# Altium footprint library SMT.PcbLib: 379 footprints (part 8 of 24)
Each footprint in its own frame and in the unit in brackets; x right, y up, seen from the top. Pads: shape width x height; smd on the part's side, far side on the other; paste and mask are expansions set on the pad; w line width, h text height; cw(c..) or ccw(c..) is an arc to the next point about the centre after c.
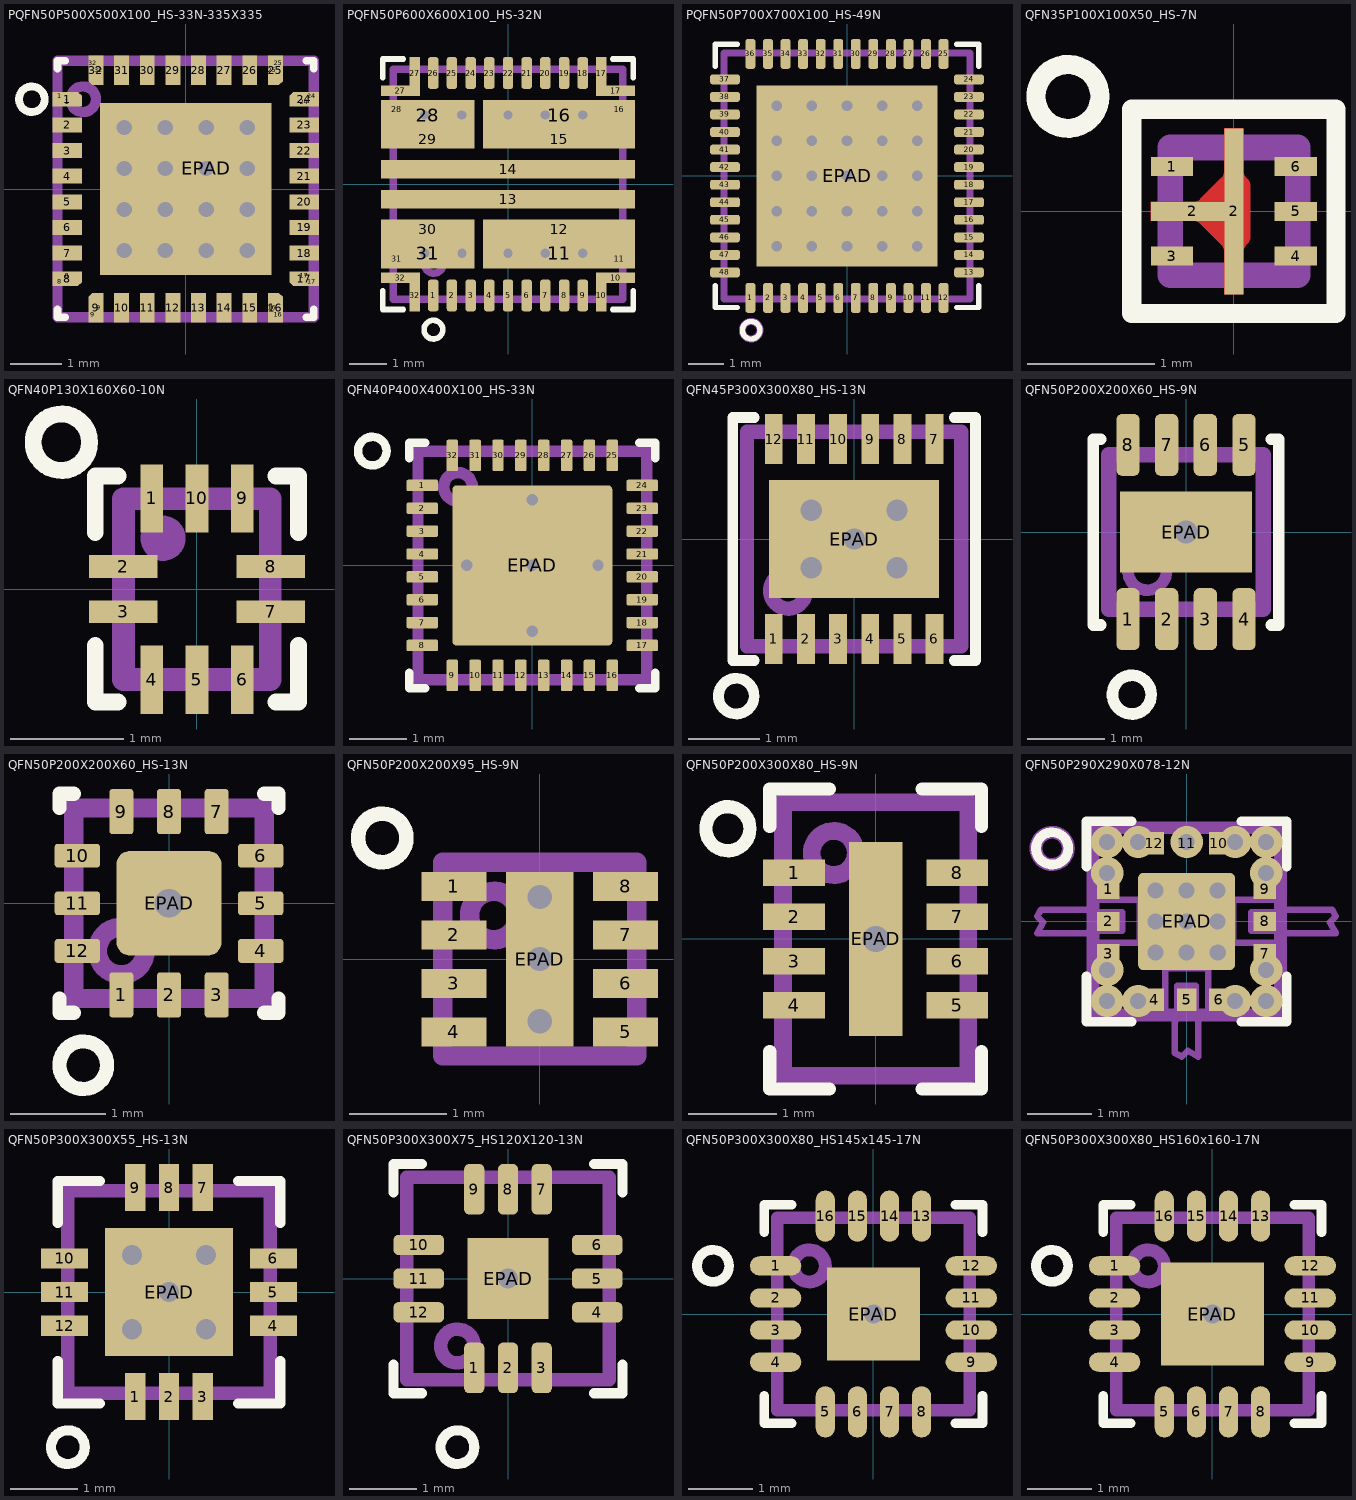
[diagram p7: the footprints below, top view; thin cyan lines are the x and y axes]

## PQFN50P500X500X100_HS-33N-335X335 [mm] "PQFN, 32-Leads, Body 5,00x5,00mm, Pitch 0,50mm, Thermal Pad 3,3x3,3mm, IPC Medium Density"
height 0.85
pads (49):
  rect 0.288x0.17 smd paste+0 mask+0.05: 1(-2.457,1.81) 8(-2.457,-1.81) 17(2.457,-1.81) 24(2.457,1.81)
  oct 0.575x0.29 smd paste+0 mask+0.05: 1(-2.313,1.75) 8(-2.313,-1.75) 17(2.313,-1.75) 24(2.313,1.75)
  rect 0.575x0.17 smd paste+0 mask+0.05: 1(-2.313,1.69) 8(-2.313,-1.69) 17(2.313,-1.69) 24(2.313,1.69)
  rect 0.575x0.29 smd paste+0 mask+0.05: 2(-2.313,1.25) 3(-2.313,0.75) 4(-2.313,0.25) 5(-2.313,-0.25) 6(-2.313,-0.75) 7(-2.313,-1.25) 18(2.313,-1.25) 19(2.313,-0.75) 20(2.313,-0.25) 21(2.313,0.25) 22(2.313,0.75) 23(2.313,1.25)
  rect 0.17x0.288 smd paste+0 mask+0.05: 9(-1.81,-2.457) 16(1.81,-2.457) 25(1.81,2.457) 32(-1.81,2.457)
  oct 0.29x0.575 smd paste+0 mask+0.05: 9(-1.75,-2.313) 16(1.75,-2.313) 25(1.75,2.313) 32(-1.75,2.313)
  rect 0.17x0.575 smd paste+0 mask+0.05: 9(-1.69,-2.313) 16(1.69,-2.313) 25(1.69,2.313) 32(-1.69,2.313)
  rect 0.29x0.575 smd paste+0 mask+0.05: 10(-1.25,-2.313) 11(-0.75,-2.313) 12(-0.25,-2.313) 13(0.25,-2.313) 14(0.75,-2.313) 15(1.25,-2.313) 26(1.25,2.313) 27(0.75,2.313) 28(0.25,2.313) 29(-0.25,2.313) 30(-0.75,2.313) 31(-1.25,2.313)
  rect 3.35x3.35 hole 0.3 copper offset -0.4,-0.4 mask+0.1: EPAD(0.4,0.4)
via -0.4,0.4 diameter 0.6 hole 0.3
via -0.4,-0.4 diameter 0.6 hole 0.3
via 0.4,-0.4 diameter 0.6 hole 0.3
via -0.4,-1.2 diameter 0.6 hole 0.3
via 0.4,-1.2 diameter 0.6 hole 0.3
via -1.2,-0.4 diameter 0.6 hole 0.3
via -1.2,0.4 diameter 0.6 hole 0.3
via -0.4,1.2 diameter 0.6 hole 0.3
via -1.2,1.2 diameter 0.6 hole 0.3
via -1.2,-1.2 diameter 0.6 hole 0.3
via 1.2,-1.2 diameter 0.6 hole 0.3
via 1.2,-0.4 diameter 0.6 hole 0.3
via 1.2,0.4 diameter 0.6 hole 0.3
via 0.4,1.2 diameter 0.6 hole 0.3
via 1.2,1.2 diameter 0.6 hole 0.3
Top Overlay:
  circle w0.15: c-3,1.75 r0.25
  lines w0.15: -2.5,-2.35 -2.5,-2.5 -2.35,-2.5 ; -2.5,2.35 -2.5,2.5 -2.35,2.5 ; 2.35,-2.5 2.5,-2.5 2.5,-2.35 ; 2.35,2.5 2.5,2.5 2.5,2.35
Top Paste:
  rectangle: -1,-1 1,1
Mechanical 1:
  circle w0.2: c-2,1.75 r0.25
  lines w0.2: -2.5,-2.5 2.5,-2.5 2.5,2.5 -2.5,2.5 -2.5,-2.5
Mechanical 20:
  text "см. datasheet  / рекомендации по прошивке" at -2.5,3.8 h2.5
3D body "PE42441.stp": height 0.94, standoff 0, extent -2.5,-2.5 2.5,2.5

## PQFN50P600X600X100_HS-32N [mm] "PQFN, 32-Leads, Body 6,00x6,00mm, Pitch 0,50mm/4,00mm, Thermal Pad, IPC Medium Density"
height 1
pads (40):
  rrect50% 0.28x0.85 smd paste-0.025 mask+0.04: 1(-2,-2.975) 2(-1.5,-2.975) 3(-1,-2.975) 4(-0.5,-2.975) 5(0,-2.975) 6(0.5,-2.975) 7(1,-2.975) 8(1.5,-2.975) 9(2,-2.975) 18(2,2.975) 19(1.5,2.975) 20(1,2.975) 21(0.5,2.975) 22(0,2.975) 23(-0.5,2.975) 24(-1,2.975) 25(-1.5,2.975) 26(-2,2.975)
  rect 0.28x0.85 smd paste-20 mask+0.04: 10(2.5,-2.975) 17(2.5,2.975) 27(-2.5,2.975) 32(-2.5,-2.975)
  rect 1.04x0.28 smd paste-20 mask+0.04: 10(2.88,-2.5) 17(2.88,2.5) 27(-2.88,2.5) 32(-2.88,-2.5)
  rect 4.07x0.8 smd paste-20 mask+0: 11(1.365,-1.85) 16(1.365,1.85)
  rrect50% 0.85x0.28 smd paste-0.025 mask+0.04: 11(2.975,-2) 16(2.975,2) 28(-2.975,2) 31(-2.975,-2)
  rect 4.07x0.5 smd mask+0.05: 12(1.365,-1.2) 15(1.365,1.2)
  rect 6.8x0.5 smd mask+0.07: 13(0,-0.4) 14(0,0.4)
  rect 2.5x0.8 smd paste-20 mask+0: 28(-2.15,1.85) 31(-2.15,-1.85)
  rect 2.5x0.5 smd mask+0.05: 29(-2.15,1.2) 30(-2.15,-1.2)
via -2.235,1.85 diameter 0.5 hole 0.25
via -1.235,1.85 diameter 0.5 hole 0.25
via 2,1.85 diameter 0.5 hole 0.25
via 1,1.85 diameter 0.5 hole 0.25
via 0,1.85 diameter 0.5 hole 0.25
via -2.23,-1.85 diameter 0.5 hole 0.25
via -1.23,-1.85 diameter 0.5 hole 0.25
via 0,-1.85 diameter 0.5 hole 0.25
via 1,-1.85 diameter 0.5 hole 0.25
via 2,-1.85 diameter 0.5 hole 0.25
Top Overlay:
  circle w0.15: c-1.995,-3.89 r0.25
  lines w0.15: -3.35,-2.85 -3.35,-3.35 -2.8,-3.35 ; -3.35,2.85 -3.35,3.35 -2.8,3.35 ; 2.8,-3.35 3.35,-3.35 3.35,-2.85 ; 2.8,3.35 3.35,3.35 3.35,2.85
Top Paste:
  region: -3.375,-1.4 -0.975,-1.4 -0.975,-1 -3.375,-1
  region: -3.375,1 -0.975,1 -0.975,1.4 -3.375,1.4
  region: -3.375,-0.6 -3.375,-0.2 3.375,-0.2 3.375,-0.6
  region: -3.375,0.2 -3.375,0.6 3.375,0.6 3.375,0.2
  region: 3.375,1 3.375,1.4 -0.525,1.4 -0.525,1
  region: 3.375,-1.4 3.375,-1 -0.525,-1 -0.525,-1.4
  region: -3.375,2.385 -3.375,2.615 -2.705,2.615 -2.475,2.385
  region: 3.375,-2.385 3.375,-2.615 2.705,-2.615 2.475,-2.385
  region: -2.385,-3.375 -2.615,-3.375 -2.615,-2.705 -2.385,-2.475
  region: -2.615,3.375 -2.385,3.375 -2.385,2.475 -2.615,2.705
  region: 2.615,-3.375 2.385,-3.375 2.385,-2.475 2.615,-2.705
  region: 3.375,2.615 3.375,2.385 2.475,2.385 2.705,2.615
  region: -2.475,-2.385 -2.705,-2.615 -3.375,-2.615 -3.375,-2.385
  region: 2.385,3.375 2.615,3.375 2.615,2.705 2.385,2.475
Mechanical 1:
  circle w0.2: c-1.985,-2.13 r0.25
  lines w0.2: -3.075,-3.075 -3.075,3.075 3.075,3.075 3.075,-3.075 -3.075,-3.075
3D body "RSG (S-PVQFN-N32).stp": height 0.97, standoff -0.01, extent -3,-3 3,3

## PQFN50P700X700X100_HS-49N [mm] "PQFN, 48-Leads, Body 7,00x7,00mm, Pitch 0,50mm, Thermal Pad 5,15x5,15mm, IPC Medium Density"
height 1
pads (49):
  rrect50% 0.28x0.85 smd paste-0.025 mask+0.05: 1(-2.75,-3.475) 2(-2.25,-3.475) 3(-1.75,-3.475) 4(-1.25,-3.475) 5(-0.75,-3.475) 6(-0.25,-3.475) 7(0.25,-3.475) 8(0.75,-3.475) 9(1.25,-3.475) 10(1.75,-3.475) 11(2.25,-3.475) 12(2.75,-3.475) 25(2.75,3.475) 26(2.25,3.475) 27(1.75,3.475) 28(1.25,3.475) 29(0.75,3.475) 30(0.25,3.475) 31(-0.25,3.475) 32(-0.75,3.475) 33(-1.25,3.475) 34(-1.75,3.475) 35(-2.25,3.475) 36(-2.75,3.475)
  rrect50% 0.85x0.28 smd paste-0.025 mask+0.05: 13(3.475,-2.75) 14(3.475,-2.25) 15(3.475,-1.75) 16(3.475,-1.25) 17(3.475,-0.75) 18(3.475,-0.25) 19(3.475,0.25) 20(3.475,0.75) 21(3.475,1.25) 22(3.475,1.75) 23(3.475,2.25) 24(3.475,2.75) 37(-3.475,2.75) 38(-3.475,2.25) 39(-3.475,1.75) 40(-3.475,1.25) 41(-3.475,0.75) 42(-3.475,0.25) 43(-3.475,-0.25) 44(-3.475,-0.75) 45(-3.475,-1.25) 46(-3.475,-1.75) 47(-3.475,-2.25) 48(-3.475,-2.75)
  rect 5.15x5.15 hole 0.3 paste-20 mask+0.07: EPAD(0,0)
via -2,2 diameter 0.5 hole 0.3
via -1,2 diameter 0.5 hole 0.3
via 0,2 diameter 0.5 hole 0.3
via 1,2 diameter 0.5 hole 0.3
via 2,2 diameter 0.5 hole 0.3
via -2,1 diameter 0.5 hole 0.3
via -1,1 diameter 0.5 hole 0.3
via 0,1 diameter 0.5 hole 0.3
via 1,1 diameter 0.5 hole 0.3
via 2,1 diameter 0.5 hole 0.3
via -2,0 diameter 0.5 hole 0.3
via -1,0 diameter 0.5 hole 0.3
via 1,0 diameter 0.5 hole 0.3
via 2,0 diameter 0.5 hole 0.3
via -2,-1 diameter 0.5 hole 0.3
via -1,-1 diameter 0.5 hole 0.3
via 0,-1 diameter 0.5 hole 0.3
via 1,-1 diameter 0.5 hole 0.3
via 2,-1 diameter 0.5 hole 0.3
via -2,-2 diameter 0.5 hole 0.3
via -1,-2 diameter 0.5 hole 0.3
via 0,-2 diameter 0.5 hole 0.3
via 1,-2 diameter 0.5 hole 0.3
via 2,-2 diameter 0.5 hole 0.3
Top Overlay:
  circle w0.15: c-2.73,-4.395 r0.25
  lines w0.15: -3.75,-3.125 -3.75,-3.75 -3.125,-3.75 ; -3.75,3.125 -3.75,3.75 -3.125,3.75 ; 3.125,-3.75 3.75,-3.75 3.75,-3.125 ; 3.125,3.75 3.75,3.75 3.75,3.125
Top Paste:
  region: -0.725,2.475 0.725,2.475 0.725,1.025 -0.725,1.025
  region: -2.475,0.725 -1.025,0.725 -1.025,-0.725 -2.475,-0.725
  region: 1.025,0.725 2.475,0.725 2.475,-0.725 1.025,-0.725
  region: -0.725,0.725 0.725,0.725 0.725,-0.725 -0.725,-0.725
  region: 1.025,2.475 2.475,2.475 2.475,1.025 1.025,1.025
  region: -2.475,2.475 -1.025,2.475 -1.025,1.025 -2.475,1.025
  region: -0.725,-1.025 0.725,-1.025 0.725,-2.475 -0.725,-2.475
  region: 1.025,-1.025 2.475,-1.025 2.475,-2.475 1.025,-2.475
  region: -2.475,-1.025 -1.025,-1.025 -1.025,-2.475 -2.475,-2.475
Mechanical 1:
  circle w0.2: c-2.73,-4.395 r0.25
  lines w0.2: -3.5,-3.5 -3.5,3.5 3.5,3.5 3.5,-3.5 -3.5,-3.5
3D body "QFN50P700X700X100_HS-49N.step": height 1, standoff 0, extent -3.501,-3.501 3.501,3.501

## QFN35P100X100X50_HS-7N [mm] "QFN, 6-Leads, Body 1,00x1,00mm, Pitch 0,00mm/0,35mm, Thermal Pad 0,15x1,00mm, IPC Medium Density"
height 0.5
pads (7):
  rect 0.33x0.15 smd mask+0.04: 1(-0.485,0.35) 3(-0.485,-0.35) 4(0.485,-0.35) 5(0.485,0) 6(0.485,0.35)
  rect 0.65x0.15 smd mask+0.04: 2(-0.325,0)
  rect 0.15x1.3 smd mask+0.04: 2(0,0)
Top Layer:
  region: -0.316,-0.075 -0.309,-0.075 -0.294,-0.078 -0.281,-0.084 -0.268,-0.092 -0.263,-0.097 -0.097,-0.263 -0.092,-0.268 -0.084,-0.281 -0.078,-0.294 -0.075,-0.309 -0.075,-0.316 -0.075,-0.65 0.075,-0.65 0.075,-0.316 0.075,-0.309 0.078,-0.294 0.084,-0.281 0.092,-0.268 0.097,-0.263 0.11,-0.25 0.114,-0.244 0.122,-0.232 0.127,-0.219 0.13,-0.205 0.13,-0.198 0.13,0.201 0.13,0.21 0.126,0.227 0.118,0.242 0.107,0.256 0.1,0.261 0.097,0.263 0.092,0.268 0.084,0.281 0.078,0.294 0.075,0.309 0.075,0.316 0.075,0.65 -0.075,0.65 -0.075,0.316 -0.075,0.309 -0.078,0.294 -0.084,0.281 -0.092,0.268 -0.097,0.263 -0.263,0.097 -0.268,0.092 -0.281,0.084 -0.294,0.078 -0.309,0.075 -0.316,0.075 -0.65,0.075 -0.65,-0.075
Top Overlay:
  circle w0.15: c-1.3,0.9 r0.25
  lines w0.15: -0.8,-0.8 0.8,-0.8 0.8,0.8 0,0.8 -0.8,0.8 -0.8,-0.8
Mechanical 1:
  lines w0.2: -0.5,-0.5 0.5,-0.5 0.5,0.5 -0.5,0.5 -0.5,-0.5
3D body "QFN0P100X100X50_HS-7N.step": height 0.5, standoff 0, extent -0.501,-0.5 0.501,0.5

## QFN40P130X160X60-10N [mm] "QFN, 10-Leads, Body 1,30x1,60mm, Pitch 0,40mm, IPC Medium Density"
height 0.6
pads (10):
  rect 0.2x0.605 smd paste+0 mask+0.04: 1(-0.4,0.803) 4(-0.4,-0.803) 5(0,-0.803) 6(0.4,-0.803) 9(0.4,0.803) 10(0,0.803)
  rect 0.605x0.2 smd paste+0 mask+0.04: 2(-0.653,0.2) 3(-0.653,-0.2) 7(0.653,-0.2) 8(0.653,0.2)
Top Overlay:
  circle w0.15: c-1.2,1.3 r0.25
  lines w0.15: -0.9,-0.5 -0.9,-1 -0.7,-1 ; -0.9,0.5 -0.9,1 -0.7,1 ; 0.7,-1 0.9,-1 0.9,-0.5 ; 0.7,1 0.9,1 0.9,0.5
Mechanical 1:
  circle w0.2: c-0.3,0.45 r0.1
  lines w0.2: -0.65,-0.8 -0.65,0.8 0.65,0.8 0.65,-0.8 -0.65,-0.8
3D body "QFN40P130X160X60-10N.step": height 0.6, standoff 0, extent -0.67,-0.82 0.67,0.82

## QFN40P400X400X100_HS-33N [mm] "QFN, 32-Leads, Body 4,00x4,00mm, Pitch 0,40mm, Thermal Pad 2,80x2,80mm, IPC Medium Density"
height 1
pads (33):
  rrect25% 0.55x0.2 smd paste+0 mask+0.04: 1(-1.925,1.4) 2(-1.925,1) 3(-1.925,0.6) 4(-1.925,0.2) 5(-1.925,-0.2) 6(-1.925,-0.6) 7(-1.925,-1) 8(-1.925,-1.4) 17(1.925,-1.4) 18(1.925,-1) 19(1.925,-0.6) 20(1.925,-0.2) 21(1.925,0.2) 22(1.925,0.6) 23(1.925,1) 24(1.925,1.4)
  rrect25% 0.2x0.55 smd paste+0 mask+0.04: 9(-1.4,-1.925) 10(-1,-1.925) 11(-0.6,-1.925) 12(-0.2,-1.925) 13(0.2,-1.925) 14(0.6,-1.925) 15(1,-1.925) 16(1.4,-1.925) 25(1.4,1.925) 26(1,1.925) 27(0.6,1.925) 28(0.2,1.925) 29(-0.2,1.925) 30(-0.6,1.925) 31(-1,1.925) 32(-1.4,1.925)
  rrect5% 2.8x2.8 hole 0.2 mask+0.05: EPAD(0,0)
via -1.15,0 diameter 0.5 hole 0.2
via 1.15,0 diameter 0.5 hole 0.2
via 0,-1.15 diameter 0.5 hole 0.2
via 0,1.15 diameter 0.5 hole 0.2
Top Overlay:
  circle w0.15: c-2.8,2 r0.25
  lines w0.15: -2.15,-1.875 -2.15,-2.15 -1.875,-2.15 ; -2.15,1.875 -2.15,2.15 -1.875,2.15 ; 1.875,-2.15 2.15,-2.15 2.15,-1.875 ; 1.875,2.15 2.15,2.15 2.15,1.875
Top Paste:
  rectangle: 0.1,0.1 1.33,1.33
  region: -0.1,1.33 -1.33,1.33 -1.33,0.1 -0.1,0.1
  region: -0.1,-0.1 -1.33,-0.1 -1.33,-1.33 -0.1,-1.33
  rectangle: 0.1,-1.33 1.33,-0.1
Mechanical 1:
  circle w0.2: c-1.3,1.375 r0.25
  lines w0.2: -2,-2 2,-2 2,2 -2,2 -2,-2
3D body "QFN40P400X400X100_HS-33N.step": height 1, standoff 0, extent -2.001,-2.001 2.001,2.001

## QFN45P300X300X80_HS-13N [mm] "QFN, 12-Leads, Body 3,00x3,00mm, Pitch 0,45mm/0,00mm, Thermal Pad 2,38x1,65mm, IPC Medium Density"
height 0.8
pads (13):
  rect 0.25x0.7 smd paste+0 mask+0.05: 1(-1.125,-1.4) 2(-0.675,-1.4) 3(-0.225,-1.4) 4(0.225,-1.4) 5(0.675,-1.4) 6(1.125,-1.4) 7(1.125,1.4) 8(0.675,1.4) 9(0.225,1.4) 10(-0.225,1.4) 11(-0.675,1.4) 12(-1.125,1.4)
  rect 2.38x1.65 hole 0.3 mask+0.05: EPAD(0,0)
via -0.6,-0.4 diameter 0.7 hole 0.3
via 0.6,-0.4 diameter 0.7 hole 0.3
via 0.6,0.4 diameter 0.7 hole 0.3
via -0.6,0.4 diameter 0.7 hole 0.3
Top Overlay:
  circle w0.15: c-1.65,-2.2 r0.25
  lines w0.15: -1.4,-1.7 -1.7,-1.7 -1.7,1.7 -1.4,1.7 ; 1.4,-1.7 1.7,-1.7 1.7,1.7 1.4,1.7
Top Paste:
  rectangle: -0.9,-0.6 0.9,0.6
Mechanical 1:
  circle w0.2: c-0.925,-0.725 r0.25
  lines w0.2: -1.5,-1.5 1.5,-1.5 1.5,1.5 -1.5,1.5 -1.5,-1.5
3D body "QFN127P600-8N.step": height 0.8, standoff 0, extent -1.5,-1.501 1.5,1.501

## QFN50P200X200X60_HS-9N [mm] "QFN, 8-Leads, Body 2,0x2,0mm (max), Pitch 0,50mm, IPC Medium Density"
height 0.6
pads (9):
  rrect50% 0.3x0.8 smd paste-0.025 mask+0.03: 1(-0.75,-1.125) 2(-0.25,-1.125) 3(0.25,-1.125) 4(0.75,-1.125) 5(0.75,1.125) 6(0.25,1.125) 7(-0.25,1.125) 8(-0.75,1.125)
  rect 1.7x1.05 hole 0.3 paste-0.05 mask+0.05: EPAD(0,0)
Top Overlay:
  circle w0.15: c-0.7,-2.1 r0.25
  lines w0.15: -1.1,-1.2 -1.2,-1.2 -1.2,1.2 -1.1,1.2 ; 1.1,-1.2 1.2,-1.2 1.2,1.2 1.1,1.2
Top Paste:
  rectangle: -0.75,-0.425 0.75,0.425
Mechanical 1:
  circle w0.15: c-0.5,-0.5 r0.25
  lines w0.2: -1,-1 -1,1 1,1 1,-1 -1,-1
3D body "DRF(S-PWSON-N8).STEP": height 0.8, standoff 0, extent -1,-1 1,1

## QFN50P200X200X60_HS-13N [mm] "QFN, 12-Leads, Body 2,00x2,00mm, Pitch 0,50mm, Thermal Pad 1,10x1,10mm, IPC Medium Density"
height 0.6
pads (13):
  rrect25% 0.25x0.475 smd paste+0 mask+0.04: 1(-0.5,-0.962) 2(0,-0.962) 3(0.5,-0.962) 7(0.5,0.962) 8(0,0.962) 9(-0.5,0.962)
  rrect25% 0.475x0.25 smd paste+0 mask+0.04: 4(0.962,-0.5) 5(0.962,0) 6(0.962,0.5) 10(-0.962,0.5) 11(-0.962,0) 12(-0.962,-0.5)
  rrect25% 1.1x1.1 hole 0.3 mask+0.04: EPAD(0,0)
Top Overlay:
  circle w0.15: c-0.9,-1.7 r0.25
  lines w0.15: -1.15,-1 -1.15,-1.15 -1,-1.15 ; -1.15,1 -1.15,1.15 -1,1.15 ; 1,-1.15 1.15,-1.15 1.15,-1 ; 1,1.15 1.15,1.15 1.15,1
Top Paste:
  rectangle: -0.4,-0.4 0.4,0.4
Mechanical 1:
  circle w0.2: c-0.5,-0.5 r0.25
  lines w0.2: -1,-1 1,-1 1,1 -1,1 -1,-1
3D body "QFN50P200X200X60_HS-13N.step": height 0.6, standoff 0, extent -1.05,-1.05 1.05,1.05

## QFN50P200X200X95_HS-9N [mm] "QFN, 8-Leads, Body 2,00x2,00mm, Pitch 0,50mm, Thermal Pad 0,70x1,60mm, IPC Medium Density"
height 0.95
pads (9):
  rect 0.67x0.3 smd mask+0.05: 1(-0.885,0.75) 2(-0.885,0.25) 3(-0.885,-0.25) 4(-0.885,-0.75) 5(0.885,-0.75) 6(0.885,-0.25) 7(0.885,0.25) 8(0.885,0.75)
  rect 0.7x1.8 hole 0.25 mask+0.05: EPAD(0,0)
via 0,0.64 diameter 0.5 hole 0.25
via 0,-0.64 diameter 0.5 hole 0.25
Top Overlay:
  circle w0.15: c-1.625,1.25 r0.25
Top Paste:
  rectangle: -0.2,-0.8 0.2,0.8
Mechanical 1:
  circle w0.2: c-0.475,0.45 r0.25
  lines w0.2: -1,-1 1,-1 1,1 -1,1 -1,-1
3D body "QFN50P200X200X95_HS-9N.step": height 0.95, standoff 0, extent -1.001,-1 1.001,1

## QFN50P200X300X80_HS-9N [mm] "QFN, 8-Leads, Body 2,00x3,00mm, Pitch 0,00mm/0,50mm, Thermal Pad 0,30x0,70mm, IPC Medium Density"
height 0.8
pads (9):
  rect 0.7x0.3 smd mask+0.05: 1(-0.925,0.75) 2(-0.925,0.25) 3(-0.925,-0.25) 4(-0.925,-0.75) 5(0.925,-0.75) 6(0.925,-0.25) 7(0.925,0.25) 8(0.925,0.75)
  rect 0.61x2.2 hole 0.3: EPAD(0,0)
Top Overlay:
  circle w0.15: c-1.675,1.25 r0.25
  lines w0.15: -1.2,-1.275 -1.2,-1.7 -0.525,-1.7 ; -1.2,1.275 -1.2,1.7 -0.525,1.7 ; 0.525,-1.7 1.2,-1.7 1.2,-1.275 ; 0.525,1.7 1.2,1.7 1.2,1.275
Top Paste:
  rectangle: -0.2,-0.7 0.2,0.7
Mechanical 1:
  circle w0.2: c-0.475,0.975 r0.25
  lines w0.2: -1.05,-1.55 -1.05,1.55 1.05,1.55 1.05,-1.55 -1.05,-1.55
3D body "QFN0P200X300X80_HS-9N.step": height 0.8, standoff 0, extent -1.051,-1.55 1.051,1.55

## QFN50P290X290X078-12N [mm] "QFN 12-leads; Body:2.90x2.90x0.78mm; Pitch:0.50; Termal Pad:1.5х1.5mm"
height 0.78
pads (13):
  rect 0.35x0.3 smd paste+0 mask+0.05: 1(-1.21,0.5) 2(-1.21,0) 3(-1.21,-0.5) 7(1.21,-0.5) 8(1.21,0) 9(1.21,0.5)
  rect 0.3x0.35 smd paste+0 mask+0.05: 4(-0.5,-1.21) 5(0,-1.21) 6(0.5,-1.21) 10(0.5,1.21) 11(0,1.21) 12(-0.5,1.21)
  rrect10% 1.5x1.5 hole 0.25 mask+0.05: EPAD(0,0)
via 0,1.23 diameter 0.5 hole 0.25
via 1.23,-1.23 diameter 0.5 hole 0.25
via 1.23,-0.75 diameter 0.5 hole 0.25
via 0.75,-1.23 diameter 0.5 hole 0.25
via -0.75,-1.23 diameter 0.5 hole 0.25
via -1.23,-1.23 diameter 0.5 hole 0.25
via -1.23,-0.75 diameter 0.5 hole 0.25
via 1.23,0.75 diameter 0.5 hole 0.25
via 1.23,1.23 diameter 0.5 hole 0.25
via 0.75,1.23 diameter 0.5 hole 0.25
via -0.75,1.23 diameter 0.5 hole 0.25
via -1.23,1.23 diameter 0.5 hole 0.25
via -1.23,0.75 diameter 0.5 hole 0.25
via 0,-0.48 diameter 0.5 hole 0.25
via 0.48,0 diameter 0.5 hole 0.25
via -0.48,0 diameter 0.5 hole 0.25
via 0,0.48 diameter 0.5 hole 0.25
via 0.481,-0.48 diameter 0.5 hole 0.25
via -0.481,-0.48 diameter 0.5 hole 0.25
via 0.48,0.481 diameter 0.5 hole 0.25
via -0.48,0.48 diameter 0.5 hole 0.25
Top Overlay:
  circle w0.15: c-2.08,1.13 r0.25
  lines w0.15: -1.55,-0.85 -1.55,-1.55 -0.85,-1.55 ; -1.55,0.85 -1.55,1.55 -0.85,1.55 ; 0.85,-1.55 1.55,-1.55 1.55,-0.85 ; 0.85,1.55 1.55,1.55 1.55,0.85
Top Paste:
  rectangle: -0.6,-0.6 0.6,0.6
Mechanical 1:
  circle w0.2: c-2.08,1.13 r0.25
  lines w0.2: -1.45,-1.45 -1.45,1.45 1.45,1.45 1.45,-1.45 -1.45,-1.45
Mechanical 20:
  circle w0.1: c0,0.001 r0.121
  circle w0.1: c0,0.484 r0.121
  circle w0.1: c0,-0.482 r0.121
  circle w0.1: c0.483,0.001 r0.121
  circle w0.1: c0.483,0.484 r0.121
  circle w0.1: c0.483,-0.482 r0.121
  circle w0.1: c-0.483,0.001 r0.121
  circle w0.1: c-0.483,0.484 r0.121
  circle w0.1: c-0.483,-0.482 r0.121
  circle w0.1: c0,1.234 r0.121
  circle w0.1: c-0.75,-1.232 r0.121
  circle w0.1: c-1.233,-0.748 r0.121
  circle w0.1: c-1.233,-1.232 r0.121
  circle w0.1: c-0.75,1.234 r0.121
  circle w0.1: c-1.233,0.751 r0.121
  circle w0.1: c-1.233,1.234 r0.121
  circle w0.1: c0.749,-1.232 r0.121
  circle w0.1: c1.233,-0.748 r0.121
  circle w0.1: c1.233,-1.232 r0.121
  circle w0.1: c0.749,1.234 r0.121
  circle w0.1: c1.233,0.751 r0.121
  circle w0.1: c1.233,1.234 r0.121
  lines w0.1: -2.311,-0.18 -2.216,-0.015 -2.309,0.078 -2.253,0.182 -1.547,0.182 -1.474,0.144 -0.999,0.144 -0.999,-0.142 -1.474,-0.142 -1.547,-0.18 -2.311,-0.18 ; -1.474,-1.473 -1.474,-0.332 -0.726,-0.332 -0.726,0.334 -1.474,0.334 -1.474,1.475 1.474,1.475 1.474,0.334 0.725,0.334 0.725,-0.332 1.474,-0.332 1.474,-1.473 0.333,-1.473 0.333,-0.724 -0.333,-0.724 -0.333,-1.473 -1.474,-1.473 ; -0.181,-2.035 -0.181,-1.546 -0.143,-1.473 -0.143,-0.998 0.143,-0.998 0.143,-1.473 0.181,-1.546 0.181,-2.093 0.016,-1.998 -0.077,-2.091 -0.181,-2.035 ; 0.999,-0.142 1.474,-0.142 1.547,-0.18 2.311,-0.18 2.216,-0.015 2.309,0.078 2.253,0.182 1.547,0.182 1.474,0.144 0.999,0.144 0.999,-0.142
  text "via in pad / заполнить" at -2.7,1.9 h1.5
3D body "Микросхема MM1-0626SSM-2.stp": height 0.78, standoff 0, extent -1.45,-1.45 1.45,1.45

## QFN50P300X300X55_HS-13N [mm] "QFN, 12-Leads, Body 3,00x3,00mm, Pitch 0,50mm, Thermal Pad 1,90x1,90mm, IPC Medium Density"
height 0.55
pads (13):
  rect 0.3x0.7 smd paste+0 mask+0.04: 1(-0.5,-1.55) 2(0,-1.55) 3(0.5,-1.55) 7(0.5,1.55) 8(0,1.55) 9(-0.5,1.55)
  rect 0.7x0.3 smd paste+0 mask+0.04: 4(1.55,-0.5) 5(1.55,0) 6(1.55,0.5) 10(-1.55,0.5) 11(-1.55,0) 12(-1.55,-0.5)
  rect 1.9x1.9 hole 0.3 mask+0.05: EPAD(0,0)
via 0.55,0.55 diameter 0.7 hole 0.3
via 0.55,-0.55 diameter 0.7 hole 0.3
via -0.55,0.55 diameter 0.7 hole 0.3
via -0.55,-0.55 diameter 0.7 hole 0.3
Top Overlay:
  circle w0.15: c-1.5,-2.3 r0.25
  lines w0.15: -1.65,-1.025 -1.65,-1.65 -1.025,-1.65 ; -1.65,1.025 -1.65,1.65 -1.025,1.65 ; 1.025,-1.65 1.65,-1.65 1.65,-1.025 ; 1.025,1.65 1.65,1.65 1.65,1.025
Top Paste:
  rectangle: -0.8,-0.8 0.8,0.8
Mechanical 1:
  circle w0.2: c-0.55,-0.55 r0.25
  lines w0.2: -1.5,-1.5 -1.5,1.5 1.5,1.5 1.5,-1.5 -1.5,-1.5
3D body "QFN50P300X300X55_HS-13N.step": height 0.55, standoff 0, extent -1.52,-1.52 1.52,1.52

## QFN50P300X300X75_HS120X120-13N [mm] "QFN, 12-Leads, Body 3,00x3,00mm, Pitch 0,50mm, Thermal Pad 1,2x1,2mm, IPC Medium Density"
height 0.75
pads (13):
  rrect50% 0.3x0.75 smd mask+0.03: 1(-0.5,-1.325) 2(0,-1.325) 3(0.5,-1.325) 7(0.5,1.325) 8(0,1.325) 9(-0.5,1.325)
  rrect50% 0.75x0.3 smd mask+0.03: 4(1.325,-0.5) 5(1.325,0) 6(1.325,0.5) 10(-1.325,0.5) 11(-1.325,0) 12(-1.325,-0.5)
  rect 1.2x1.2 hole 0.3: EPAD(0,0)
Top Overlay:
  circle w0.15: c-0.75,-2.5 r0.25
  lines w0.15: -1.7,-1.275 -1.7,-1.7 -1.275,-1.7 ; -1.7,1.275 -1.7,1.7 -1.275,1.7 ; 1.275,-1.7 1.7,-1.7 1.7,-1.275 ; 1.275,1.7 1.7,1.7 1.7,1.275
Top Paste:
  region: -0.6,-0.6 0.6,-0.6 0.6,0.6 -0.6,0.6
Mechanical 1:
  circle w0.2: c-0.75,-1 r0.25
  lines w0.2: 1.5,-1.5 1.5,1.5 -1.5,1.5 -1.5,-1.5 1.5,-1.5 ; 1.5,-1.5 1.5,-1.5
3D body "QFN16-3X3.STEP": height 0.91, standoff 0.01, extent -1.5,-1.5 1.5,1.5

## QFN50P300X300X80_HS145x145-17N [mm] "QFN, 16-Leads, Body 3,00x3,00mm, Pitch 0,50mm, Thermal Pad 1,45x1,45mm, IPC Medium Density"
height 0.8
pads (17):
  oval 0.8x0.3 smd mask+0.03: 1(-1.525,0.75) 2(-1.525,0.25) 3(-1.525,-0.25) 4(-1.525,-0.75) 9(1.525,-0.75) 10(1.525,-0.25) 11(1.525,0.25) 12(1.525,0.75)
  oval 0.3x0.8 smd mask+0.03: 5(-0.75,-1.525) 6(-0.25,-1.525) 7(0.25,-1.525) 8(0.75,-1.525) 13(0.75,1.525) 14(0.25,1.525) 15(-0.25,1.525) 16(-0.75,1.525)
  rect 1.45x1.45 hole 0.3: EPAD(0,0)
Top Overlay:
  circle w0.15: c-2.5,0.75 r0.25
  lines w0.15: -1.7,-1.275 -1.7,-1.7 -1.275,-1.7 ; -1.7,1.275 -1.7,1.7 -1.275,1.7 ; 1.275,-1.7 1.7,-1.7 1.7,-1.275 ; 1.275,1.7 1.7,1.7 1.7,1.275
Top Paste:
  region: -0.6,0.6 -0.6,-0.6 0.6,-0.6 0.6,0.6
Mechanical 1:
  circle w0.2: c-1,0.75 r0.25
  lines w0.2: -1.5,-1.5 -1.5,1.5 1.5,1.5 1.5,-1.5 -1.5,-1.5 ; -1.5,-1.5 -1.5,-1.5
3D body "QFN16-3X3.STEP": height 0.91, standoff 0.01, extent -1.5,-1.5 1.5,1.5

## QFN50P300X300X80_HS160x160-17N [mm] "QFN, 16-Leads, Body 3,00x3,00mm, Pitch 0,50mm, Thermal Pad 1,60x1,60mm, IPC Medium Density"
height 0.8
pads (17):
  oval 0.8x0.3 smd mask+0.03: 1(-1.525,0.75) 2(-1.525,0.25) 3(-1.525,-0.25) 4(-1.525,-0.75) 9(1.525,-0.75) 10(1.525,-0.25) 11(1.525,0.25) 12(1.525,0.75)
  oval 0.3x0.8 smd mask+0.03: 5(-0.75,-1.525) 6(-0.25,-1.525) 7(0.25,-1.525) 8(0.75,-1.525) 13(0.75,1.525) 14(0.25,1.525) 15(-0.25,1.525) 16(-0.75,1.525)
  rect 1.6x1.6 hole 0.3: EPAD(0,0)
Top Overlay:
  circle w0.15: c-2.5,0.75 r0.25
  lines w0.15: -1.7,-1.275 -1.7,-1.7 -1.275,-1.7 ; -1.7,1.275 -1.7,1.7 -1.275,1.7 ; 1.275,-1.7 1.7,-1.7 1.7,-1.275 ; 1.275,1.7 1.7,1.7 1.7,1.275
Top Paste:
  region: -0.6,0.6 -0.6,-0.6 0.6,-0.6 0.6,0.6
Mechanical 1:
  circle w0.2: c-1,0.75 r0.25
  lines w0.2: -1.5,-1.5 -1.5,1.5 1.5,1.5 1.5,-1.5 -1.5,-1.5 ; -1.5,-1.5 -1.5,-1.5
3D body "QFN16-3X3.STEP": height 0.91, standoff 0.01, extent -1.5,-1.5 1.5,1.5